# Altium footprint library Lib.PcbLib: 177 footprints (part 8 of 12)
Each footprint in its own frame and in the unit in brackets; x right, y up, seen from the top. Pads: shape width x height; smd on the part's side, far side on the other; paste and mask are expansions set on the pad; w line width, h text height; cw(c..) or ccw(c..) is an arc to the next point about the centre after c.
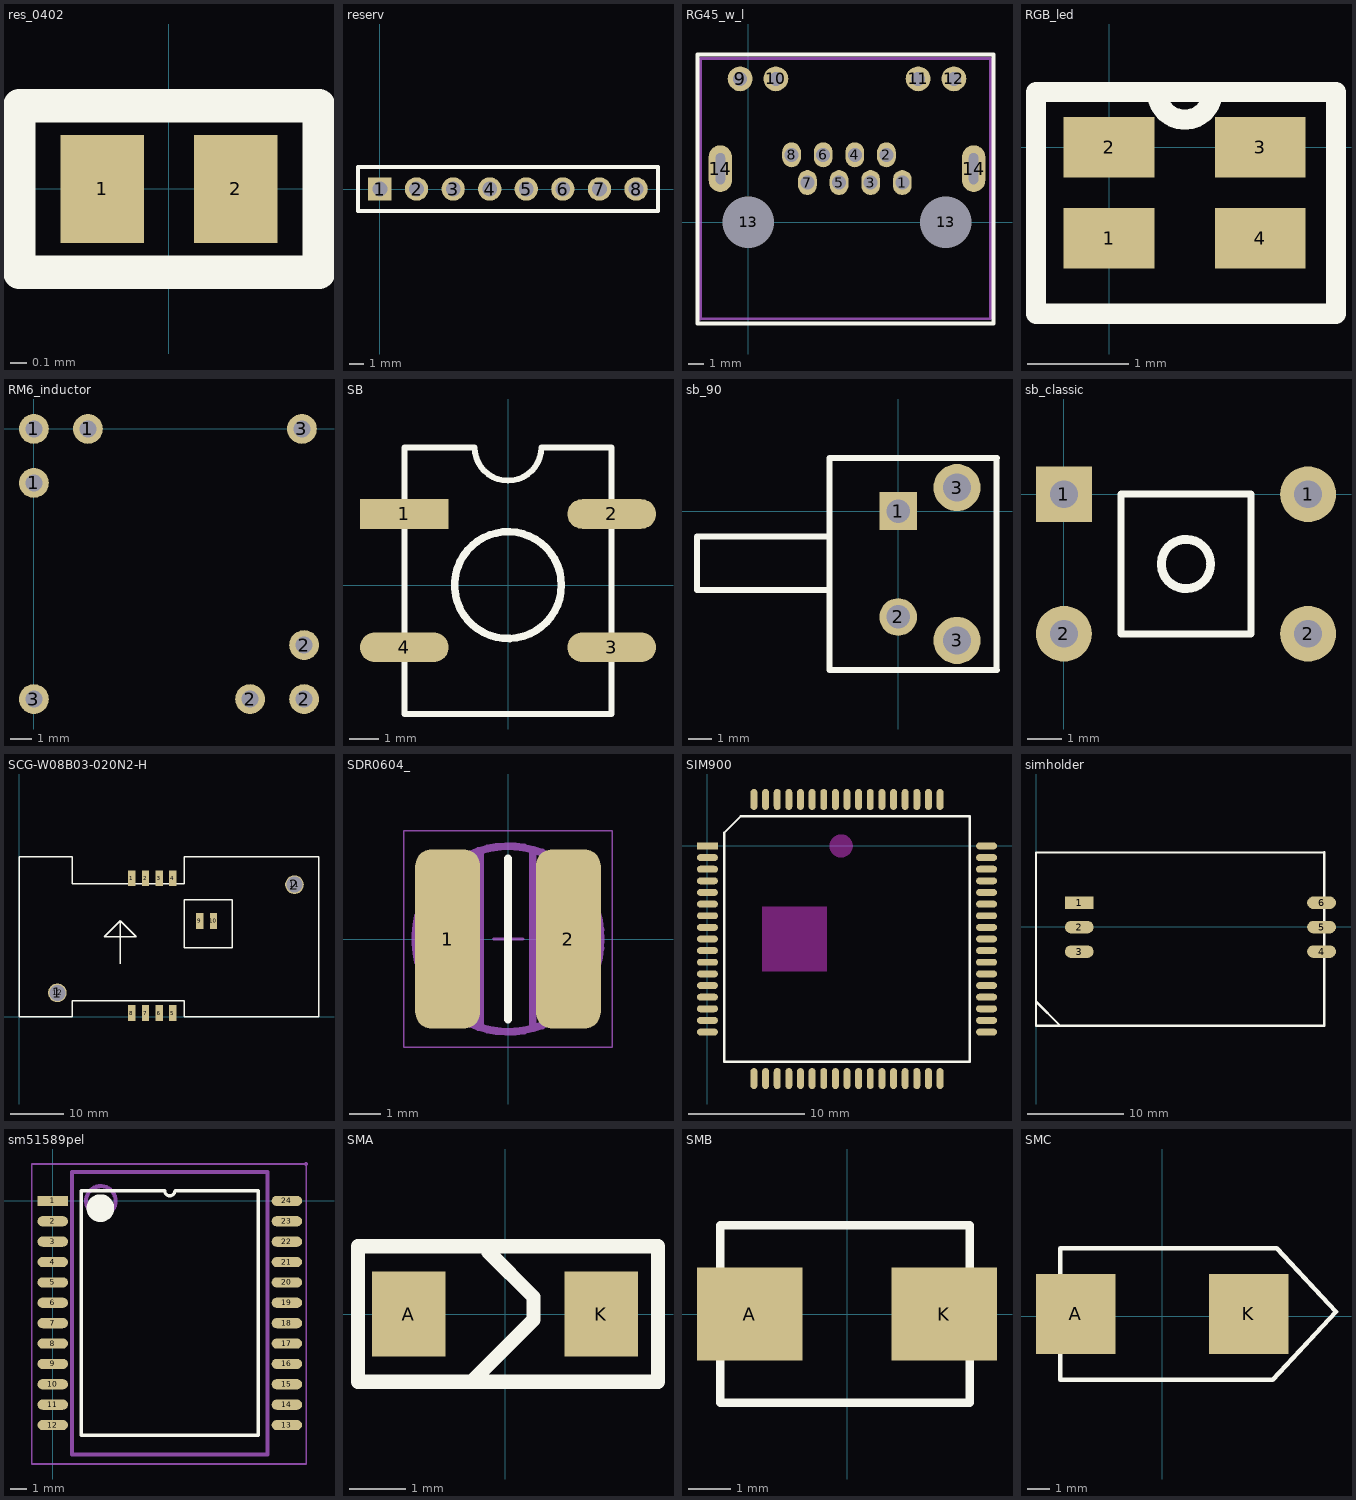
[diagram p7: the footprints below, top view; thin cyan lines are the x and y axes]

## res_0402 [mm]
pads (2):
  rect 0.5x0.65 smd: 1(-0.4,0) 2(0.4,0)
Top Overlay:
  lines w0.2: -0.9,-0.5 0.9,-0.5 0.9,0.5 -0.9,0.5 -0.9,0.2 -0.9,-0.5
3D body "User Library-0402R.step": height 0.34, standoff 0, extent -0.52,-0.3 0.52,0.3

## reserv [mm]
pads (8):
  rect 1.6x1.6 hole 1: 1(0,0)
  round 1.6 hole 1: 2(2.5,0) 3(5,0) 4(7.5,0) 5(10,0) 6(12.5,0) 7(15,0) 8(17.5,0)
Top Overlay:
  lines w0.254: -1.5,-1.5 19,-1.5 19,1.5 -1.5,1.5 -1.5,-1.5

## RG45_w_l [mm]
pads (16):
  oval 1.2x1.6 hole 0.9: 1(9.9,2.54) 2(8.88,4.32) 3(7.87,2.54) 4(6.85,4.32) 5(5.84,2.54) 6(4.82,4.32) 7(3.81,2.54) 8(2.79,4.32)
  round 1.6 hole 0.9: 9(-0.51,9.2) 10(1.78,9.2) 11(10.92,9.2) 12(13.21,9.2)
  round 1.524 hole 3.3: 13(0,0) 13(12.7,0)
  oval 1.5x3 hole 0.6 slot 2 at 90 deg: 14(-1.78,3.43) 14(14.48,3.43)
Top Overlay:
  lines w0.254: -3.25,-6.5 15.5,-6.5 15.75,-6.5 15.75,10.75 -3.25,10.75 -3.25,-6.5
Mechanical 11:
  lines w0.2: -3.075,-6.225 -3.05,10.5 15.575,10.5 15.575,-6.2 -3.075,-6.225
Mechanical 13:
  lines w0.1: -3.072,-6.223 15.572,-6.223 15.572,10.498 -3.072,10.498 -3.072,-6.223
3D body "16m2834_2-406549-1.stp": height 14.8, standoff -3.92, extent -3.072,-6.223 15.572,10.498

## RGB_led [mm]
pads (4):
  rect 0.9x0.6 smd: 1(0,-0.9) 2(0,0) 3(1.5,0) 4(1.5,-0.9)
Top Overlay:
  lines w0.2: -0.725,-1.65 2.25,-1.65 2.25,0.55 0.475,0.55 ccw(c0.75,0.55) 1.025,0.55 -0.725,0.55 -0.725,-1.65
3D body "User Library-HSMF-C114.step": height 0.34, standoff -0.01, extent -0.075,-1.2 1.525,0.3

## RM6_inductor [mm]
pads (8):
  round 1.4 hole 0.8: 1(0,-2.54) 1(0,0) 1(2.54,0) 2(10.16,-12.7) 2(12.7,-12.7) 2(12.7,-10.16) 3(0,-12.7) 3(12.6,0)
3D body "User Library-RM6-1.STEP": height 13.5, standoff -3.77, extent -1.594,-14.045 14.094,1.645

## SB [mm]
pads (4):
  rect 3x1 smd: 1(-3.503,2.4)
  oval 3x1 smd: 2(3.497,2.4) 3(3.497,-2.1) 4(-3.503,-2.1)
Top Overlay:
  circle w0.254: c-0.003,0 r1.803
  lines w0.2: -3.503,-4.35 -3.503,4.65 -1.128,4.65 ccw(c-0.003,4.65) 1.122,4.65 3.497,4.65 3.497,-4.35 -3.503,-4.35

## sb_90 [mm]
pads (4):
  rect 1.6x1.6 hole 1: 1(0,0)
  round 1.6 hole 1: 2(0,-4.5)
  round 2 hole 1.2: 3(2.5,-5.5) 3(2.5,1)
Top Overlay:
  lines w0.254: -2.925,-3.35 -8.55,-3.35 -8.55,-1.075 -2.925,-1.075 ; -2.925,-6.75 -2.925,2.25 -2.875,2.25 4.2,2.25 4.175,2.25 4.175,-6.75 4.2,-6.75 -2.925,-6.75
3D body "User Library-Tact Sw RA 8_35mm 1-1825027-1.STEP": height 7, standoff -3.52, extent -8.415,-6.504 3.942,1.904

## sb_classic [mm]
pads (4):
  rect 1.6x1.6 hole 0.8: 1(0,0)
  round 1.6 hole 0.8: 1(7,0) 2(0,-4) 2(7,-4)
Top Overlay:
  circle w0.254: c3.5,-2 r0.707
  lines w0.2: 1.635,-4 5.365,-4 5.365,0 1.635,0 1.635,-4

## SCG-W08B03-020N2-H [mm]
height 3
pads (14):
  round 3.5 hole 3: 1(7.2,4.5) 2(51.7,24.8)
  rect 1.4x3 smd: 1(21.2,26) 2(23.74,26) 3(26.3,26) 4(28.84,26) 5(28.84,0.7) 6(26.3,0.7) 7(23.74,0.7) 8(21.2,0.7) 9(33.92,18) 10(36.5,18)
  round 2.3 on Drill Guide: 11(51.71,24.8) 12(7.26,4.48)
Top Overlay:
  lines w0.254: 19,10 19,18 ; 19,18 22,15 16,15 19,18 ; 0,0 10,0 10,3 31,3 31,0 56.3,0 56.3,30 31,30 31,25 10,25 10,30 0,30 0,0 ; 31,13 31,22 40,22 40,13 31,13

## SDR0604_ [mm]
height 4.8
pads (2):
  rrect50% 2.1x5.8 smd: 1(-1.95,0) 2(1.95,0)
Top Overlay:
  lines w0.254: 0,-2.6 0,2.6
Mechanical 3:
  circle w0.254: c0,0 r3
  lines w0.254: -0.9,-2.8 -0.9,2.8 ; 0.8,-2.8 0.8,2.8
Mechanical 13:
  circle w0.1: c0.012,0 r3.019
Mechanical 15:
  lines w0.05: -3.375,-3.5 -3.375,3.5 3.375,3.5 3.375,-3.5 -3.375,-3.5
  lines w0.1: -0.462,0 0.488,0 ; 0.013,-0.475 0.013,0.475
3D body "69540.stp": height 4.8, standoff 0, extent -2.925,-2.8 2.875,3

## SIM900 [mm]
height 2
pads (68):
  rect 1.8x0.6 smd: 1(0,0)
  oval 1.8x0.6 smd: 2(0,-1) 3(0,-2) 4(0,-3) 5(0,-4) 6(0,-5) 7(0,-6) 8(0,-7) 9(0,-8) 10(0,-9) 11(0,-10) 12(0,-11) 13(0,-12) 14(0,-13) 15(0,-14) 16(0,-15) 17(0,-16) 35(24,-16) 36(24,-15) 37(24,-14) 38(24,-13) 39(24,-12) 40(24,-11) 41(24,-10) 42(24,-9) 43(24,-8) 44(24,-7) 45(24,-6) 46(24,-5) 47(24,-4) 48(24,-3) 49(24,-2) 50(24,-1) 51(24,0)
  oval 0.6x1.8 smd: 18(4,-20) 19(5,-20) 20(6,-20) 21(7,-20) 22(8,-20) 23(9,-20) 24(10,-20) 25(11,-20) 26(12,-20) 27(13,-20) 28(14,-20) 29(15,-20) 30(16,-20) 31(17,-20) 32(18,-20) 33(19,-20) 34(20,-20) 52(20,4) 53(19,4) 54(18,4) 55(17,4) 56(16,4) 57(15,4) 58(14,4) 59(13,4) 60(12,4) 61(11,4) 62(10,4) 63(9,4) 64(8,4) 65(7,4) 66(6,4) 67(5,4) 68(4,4)
Top Overlay:
  lines w0.2: 1.435,-18.565 22.565,-18.565 22.565,2.565 2.87,2.565 1.435,1.13 1.435,-18.565
Keep-Out Layer:
  circle w1: c11.5,0 r0.5
  rectangle: 4.7,-10.8 10.3,-5.2

## simholder [mm]
pads (6):
  rect 3x1.3 smd: 1(4.5,2.5)
  oval 3x1.3 smd: 2(4.5,-0.04) 3(4.5,-2.58) 4(29.7,-2.58) 5(29.7,-0.04) 6(29.7,2.5)
Top Overlay:
  lines w0.2: 0,-10.27 0,7.73 30,7.73 ; 0,-7.77 2.5,-10.27
  lines w0.254: 0,-10.27 30,-10.27 30,7.73

## sm51589pel [mm]
pads (24):
  rect 1.9x0.64 smd: 1(0,0)
  oval 1.9x0.64 smd: 2(0,-1.27) 3(0,-2.54) 4(0,-3.81) 5(0,-5.08) 6(0,-6.35) 7(0,-7.62) 8(0,-8.89) 9(0,-10.16) 10(0,-11.43) 11(0,-12.7) 12(0,-13.97) 13(14.6,-13.97) 14(14.6,-12.7) 15(14.6,-11.43) 16(14.6,-10.16) 17(14.6,-8.89) 18(14.6,-7.62) 19(14.6,-6.35) 20(14.6,-5.08) 21(14.6,-3.81) 22(14.6,-2.54) 23(14.6,-1.27) 24(14.6,0)
Top Overlay:
  circle w1: c2.975,-0.45 r0.361
  lines w0.2: 1.785,-14.605 1.785,0.635 6.982,0.635 ccw(c7.3,0.635) 7.617,0.635 12.815,0.635 12.815,-14.605 1.785,-14.605
Mechanical 11:
  lines w0.254: 1.2,-15.8 13.4,-15.8 13.4,1.8 1.2,1.8 1.2,-15.8
Mechanical 13:
  circle w0.254: c3,0 r0.922
  lines w0.1: 1.2,-15.8 13.4,-15.8 13.4,1.8 1.2,1.8 1.2,-15.8
Mechanical 15:
  region: -1.3,2.3
  lines w0.1: -1.3,-16.4 -1.3,2.3 15.8,2.3 15.8,-16.4 -1.3,-16.4
  lines w0.254: 15.8,2.3 15.8,2.3
3D body: height 6, standoff 0.25, extent 1.2,-15.8 13.4,1.8

## SMA [mm]
height 2
pads (2):
  rect 1.3x1.5 smd: A(-1.7,0) K(1.7,0)
Top Overlay:
  lines w0.254: -0.6,-1.2 0.5,-0.1 0.5,0.2 0.5,0.3 -0.3,1.1 -0.3,1.2 ; -2.6,-1.2 2.7,-1.2 2.7,1.2 -2.6,1.2 -2.6,-1.2

## SMB [mm]
pads (2):
  rect 2.5x2.2 smd: A(-2.3,0) K(2.3,0)
Top Overlay:
  lines w0.2: -3,-2.1 2.9,-2.1 2.9,2.1 -3,2.1 -3,-1.95 -3,-2.1
3D body "User Library-DIOM5539X24.STEP": height 2.45, standoff 0.03, extent -2.75,-1.95 2.75,1.95

## SMC [mm]
pads (2):
  rect 3.5x3.5 smd: A(-3.809,0.11) K(3.809,0.11)
Top Overlay:
  lines w0.2: -4.5,-2.78 4.855,-2.78 7.642,0.205 5.033,3 -4.5,3 -4.5,-2.78
3D body "SW3DPS-SMC-DEFAULT.STEP": height 2.8, standoff 0, extent -3.809,-3 3.809,3.22